# Altium footprint library MyPcbLib.PcbLib: 223 footprints (part 14 of 14)
Each footprint in its own frame and in the unit in brackets; x right, y up, seen from the top. Pads: shape width x height; smd on the part's side, far side on the other; paste and mask are expansions set on the pad; w line width, h text height; cw(c..) or ccw(c..) is an arc to the next point about the centre after c.
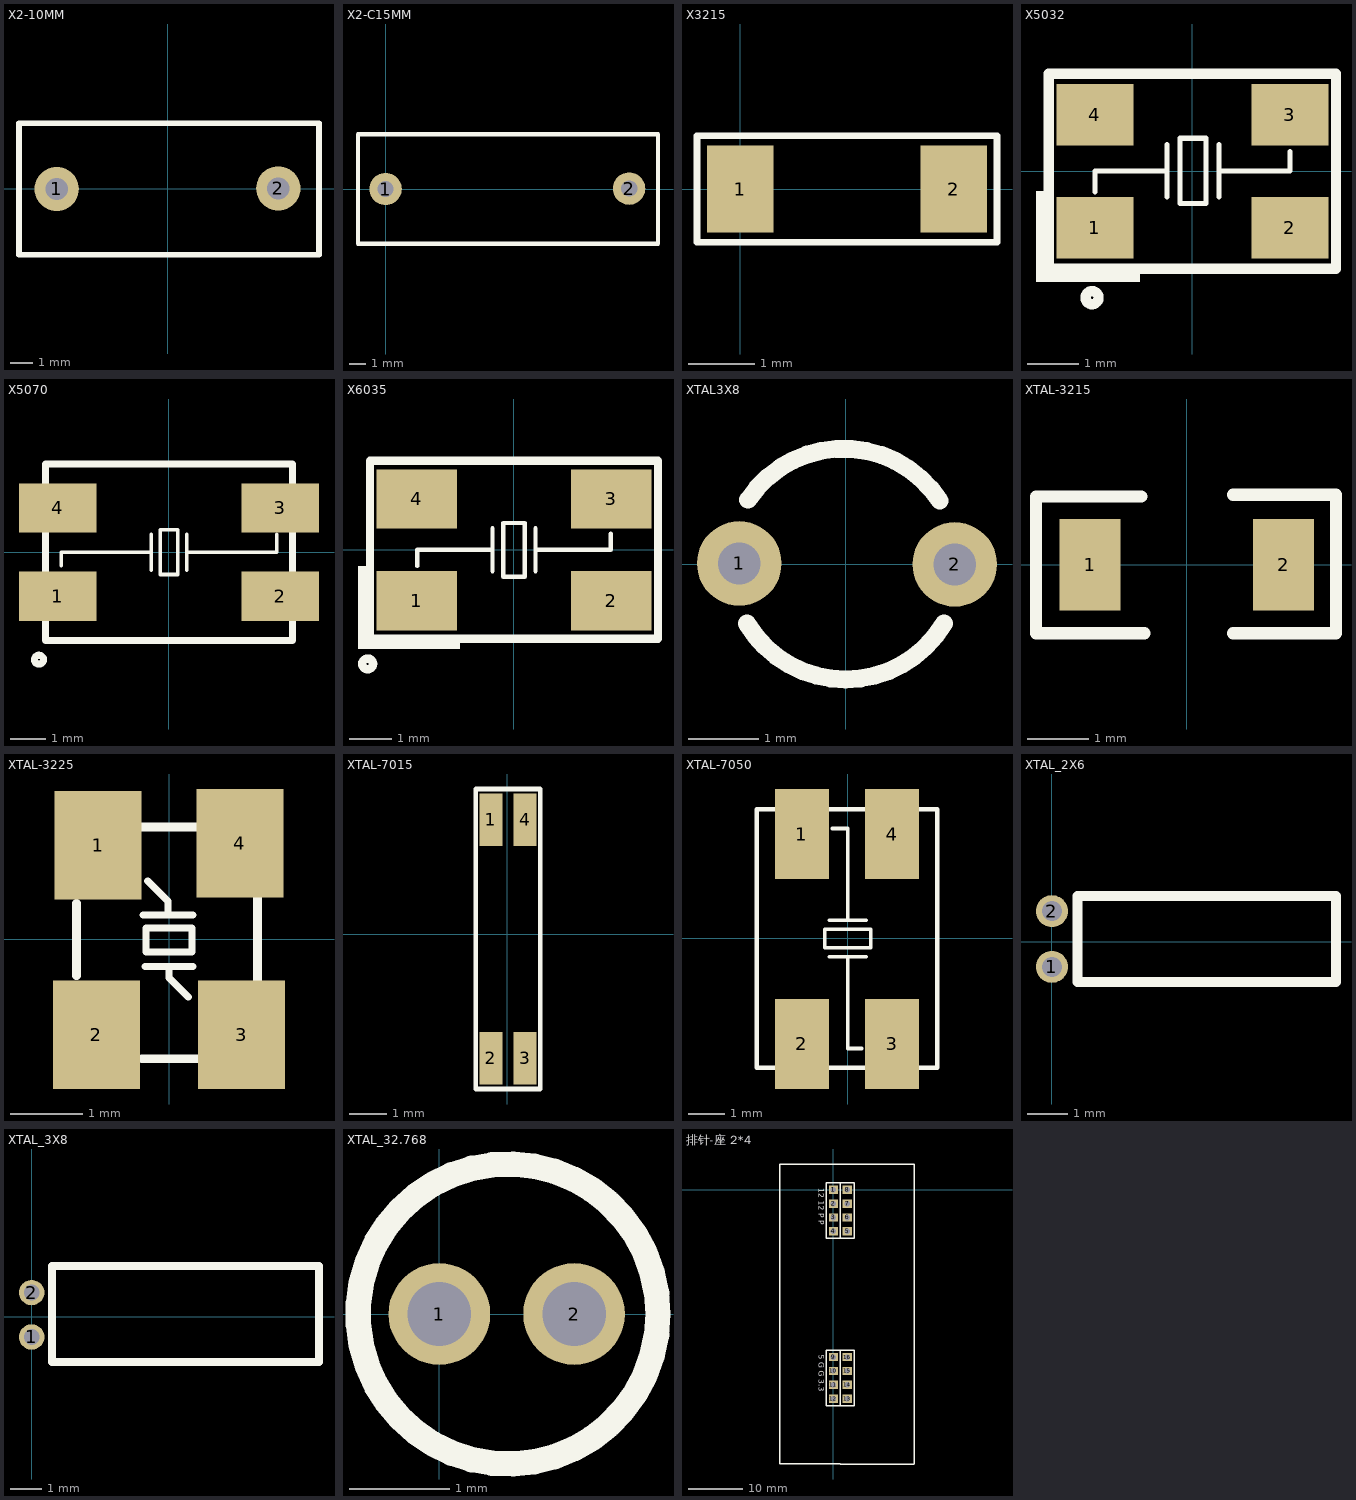
[diagram p13: the footprints below, top view; thin cyan lines are the x and y axes]

## X2-10MM [mm] "18.25MM*11.4MM*5.78MM0.1UF 脚距15MM"
pads (2):
  round 2 hole 1: 1(-5,-0.013) 2(5,0.013)
Top Overlay:
  lines w0.254: -6.702,-2.984 6.836,-2.984 6.836,2.959 -6.702,2.959 -6.702,-2.984
3D body "X2-10MM.step": height 12, standoff -2.81, extent -6.5,-2.489 6.5,2.512

## X2-C15MM [mm] "18.25MM*11.4MM*5.78MM0.1UF 脚距15MM"
pads (2):
  round 2 hole 1: 1(0,0) 2(15.011,0.025)
Top Overlay:
  lines w0.254: -1.702,-3.378 16.789,-3.378 16.789,3.378 -1.702,3.378 -1.702,-3.378
3D body "X2-15MM.step": height 14, standoff -2.81, extent -1.431,-3.496 16.569,3.505

## X3215 [mm]
pads (2):
  rect 1x1.3 smd: 1(0,0) 2(3.2,0)
Top Overlay:
  lines w0.1: -0.65,-0.8 -0.65,0.8 3.85,0.8 3.85,-0.8 -0.65,-0.8
3D body "User Library-X3215.STEP": height 0.81, standoff 0, extent 0,-0.762 3.2,0.738

## X5032 [mm]
pads (4):
  rect 1.5x1.2 smd: 1(-1.9,-1.1) 2(1.9,-1.1) 3(1.9,1.1) 4(-1.9,1.1)
Top Overlay:
  circle w0.2: c-1.956,-2.464 r0.127
  rectangle: -3.023,-2.159 -1.016,-1.905
  rectangle: -3.048,-2.159 -2.87,-0.381
  lines w0.1: -1.897,-0.406 -1.897,0.008 -0.496,0.008 ; -0.496,-0.5 -0.496,0.516 ; 0.52,-0.5 0.52,0.516 ; 0.52,0.008 1.902,0.008 1.905,0.016 1.905,0.381 ; -0.242,-0.627 -0.242,0.643 0.266,0.643 0.266,0.326 0.266,-0.309 0.266,-0.627 -0.242,-0.627
  lines w0.2: -2.8,-1.9 2.8,-1.9 2.8,1.9 -2.8,1.9 -2.8,-1.9
3D body "User Library-CRYSTALSMD5X32.STEP": height 1, standoff 0, extent -2.5,-1.6 2.5,1.6

## X5070 [mm]
pads (4):
  rect 2.2x1.4 smd: 1(-3.15,-1.25) 2(3.15,-1.25) 3(3.15,1.25) 4(-3.15,1.25)
Top Overlay:
  circle w0.2: c-3.683,-3.048 r0.127
  lines w0.1: -3.048,-0.381 -3.048,0 -0.508,0 ; -0.508,-0.508 -0.508,0.508 ; 0.508,-0.508 0.508,0.508 ; 0.508,0 3.048,0 3.048,0.508 ; -0.254,-0.635 -0.254,0.635 0.254,0.635 0.254,-0.635 -0.254,-0.635
  lines w0.2: -3.5,-2.5 3.5,-2.5 3.5,2.5 -3.5,2.5 -3.5,-2.5
3D body "User Library-GeyerElectronics_KX13.STEP": height 1.31, standoff 0, extent -3.576,-2.54 3.424,2.46

## X6035 [mm]
pads (4):
  rect 1.9x1.4 smd: 1(-2.3,-1.2) 2(2.3,-1.2) 3(2.3,1.2) 4(-2.3,1.2)
Top Overlay:
  circle w0.2: c-3.454,-2.692 r0.127
  rectangle: -3.658,-2.337 -1.27,-2.108
  rectangle: -3.683,-2.337 -3.48,-0.381
  lines w0.1: -2.286,-0.381 -2.286,0 -2.032,0 -0.508,0 ; -0.508,-0.508 -0.508,0.508 ; 0.508,-0.508 0.508,0.508 ; 0.508,0 2.286,0 2.286,0.381 ; -0.254,-0.635 -0.254,0.635 0.254,0.635 0.254,-0.635 -0.254,-0.635
  lines w0.2: -3.4,-2.1 3.4,-2.1 3.4,2.1 -3.4,2.1 -3.4,-2.1
3D body "User Library-CRYSTALSMD5X32.STEP": height 1, standoff 0, extent -2.5,-1.6 2.5,1.6

## XTAL3X8 [mm]
pads (2):
  round 1.2 hole 0.6: 1(-1.509,0.013) 2(1.55,0)
Top Overlay:
  lines w0.254: -1.4,-0.841 ccw(c-0.002,-0.002) 1.398,-0.839 ; -1.386,0.917 cw(c-0.029,0.013) 1.337,0.903
3D body "User Library-Crystal TH_.STEP": height 9.28, standoff -1.5, extent -1.707,-1.586 1.743,1.614

## XTAL-3215 [mm]
height 3.5
pads (2):
  rect 1x1.5 smd: 1(-1.581,0) 2(1.581,0)
Top Overlay:
  lines w0.2: -0.743,1.118 -2.464,1.118 -2.464,-1.118 -0.692,-1.118 ; 0.756,-1.118 2.438,-1.118 2.438,1.143 0.756,1.143
3D body "XTAL3215.step": height 0.81, standoff 0, extent -1.593,-0.75 1.607,0.75

## XTAL-3225 [mm]
pads (4):
  rect 1.2x1.5 smd: 1(-0.978,1.295) 2(-1.003,-1.321) 3(1.003,-1.321) 4(0.978,1.321)
Top Overlay:
  lines w0.1: -0.356,0.33 0.33,0.33 ; -0.33,-0.381 0.33,-0.381 ; -0.292,0.8 -0.013,0.521 -0.013,0.33 ; 0,-0.381 0,-0.533 0.267,-0.8 ; -0.318,-0.178 -0.318,0.152 0.318,0.152 0.318,-0.178 -0.318,-0.178
  lines w0.12: -1.278,-0.505 -1.278,0.495 ; -0.378,-1.655 0.422,-1.655 ; -0.378,1.545 0.422,1.545 ; 1.222,-0.605 1.222,0.595
3D body "XTAL-3225.STEP": height 0.8, standoff 0, extent -1.268,-1.651 1.232,1.549

## XTAL-7015 [mil]
pads (4):
  rect 23.62x55 smd: 1(-17,119) 2(-17,-129.03) 3(18.43,-129.03) 4(18.43,119)
Top Overlay:
  lines w4.72: -32.75,-161 -32.75,151 34.18,151 34.18,-161 -32.75,-161
3D body "xtal6713.STEP": height 51.18, standoff 0, extent -25,-148.9 26.18,136.9

## XTAL-7050 [mm]
pads (4):
  rect 1.5x2.5 smd: 1(-1.27,2.894) 2(-1.27,-2.922) 3(1.23,-2.922) 4(1.23,2.894)
Top Overlay:
  lines w0.1: -0.508,-0.508 0.508,-0.508 ; -0.508,0.508 0.508,0.508 ; -0.432,3.048 0,3.048 0,0.508 ; 0,-0.508 0,-3.048 0.381,-3.048 ; -0.635,-0.254 -0.635,0.254 0.635,0.254 0.635,-0.254 -0.635,-0.254
  lines w0.12: -2.52,-3.581 -2.52,3.581 2.48,3.581 2.48,-3.581 -2.52,-3.581
3D body "XTAL-7050.STEP": height 1, standoff 0, extent -2.5,-3.449 2.5,3.551

## XTAL_2X6 [mm]
pads (2):
  round 0.8 hole 0.5: 1(0,-0.635) 2(0,0.762)
Top Overlay:
  lines w0.254: 0.635,-1.016 7.112,-1.016 7.112,1.143 0.635,1.143 0.635,-1.016
3D body: height 2, standoff 0, extent 0.912,-0.94 6.912,1.052

## XTAL_3X8 [mm]
pads (2):
  round 0.8 hole 0.5: 1(0,-0.635) 2(0,0.762)
Top Overlay:
  lines w0.254: 0.635,-1.422 0.635,1.6 9.042,1.6 9.042,-1.422 0.635,-1.422
3D body: height 3, standoff 0, extent 0.912,-1.436 8.912,1.552

## XTAL_32.768 [mil] "32.768k柱式晶振（未加焊）"
height 314.96
pads (2):
  round 40 hole 25: 1(0,0) 2(53,0)
Top Overlay:
  circle w10: c27,0 r59
3D body "CRYSTAL_N.stp": height 354.33, standoff -118.11, extent -32.87,-59.06 85.24,59.06

## 排针-座 2*4 [mil]
pads (16):
  rect 65x60 hole 40: 1(0,0) 2(0,-100) 3(0,-200) 4(0,-300) 5(100,-300) 6(100,-200) 7(100,-100) 8(100,0) 9(0,-1205) 10(0,-1305) 11(0,-1405) 12(0,-1505) 13(100,-1505) 14(100,-1405) 15(100,-1305) 16(100,-1205)
Top Overlay:
  lines w10: -384.96,-1974.92 -384.96,185.08 49.96,185.08 50,185.04 581.5,185.04 581.5,-1974.96 ; -384.92,-1974.96 50,-1974.96 50.04,-1975 581.54,-1975 ; 50,-1555 50,-1155 ; 50,-350 50,50 ; -50,-1555 150,-1555 150,-1155 -50,-1155 -50,-1555 ; -50,-350 -50,50 150,50 150,-350 -50,-350
  text "5 G G 3.3" at -105,-1190 h39.37
  text "12 12 P P" at -105,10 h39.37